# Altium footprint library ALL.PcbLib: 385 footprints (part 1 of 25)
Each footprint in its own frame and in the unit in brackets; x right, y up, seen from the top. Pads: shape width x height; smd on the part's side, far side on the other; paste and mask are expansions set on the pad; w line width, h text height; cw(c..) or ccw(c..) is an arc to the next point about the centre after c.
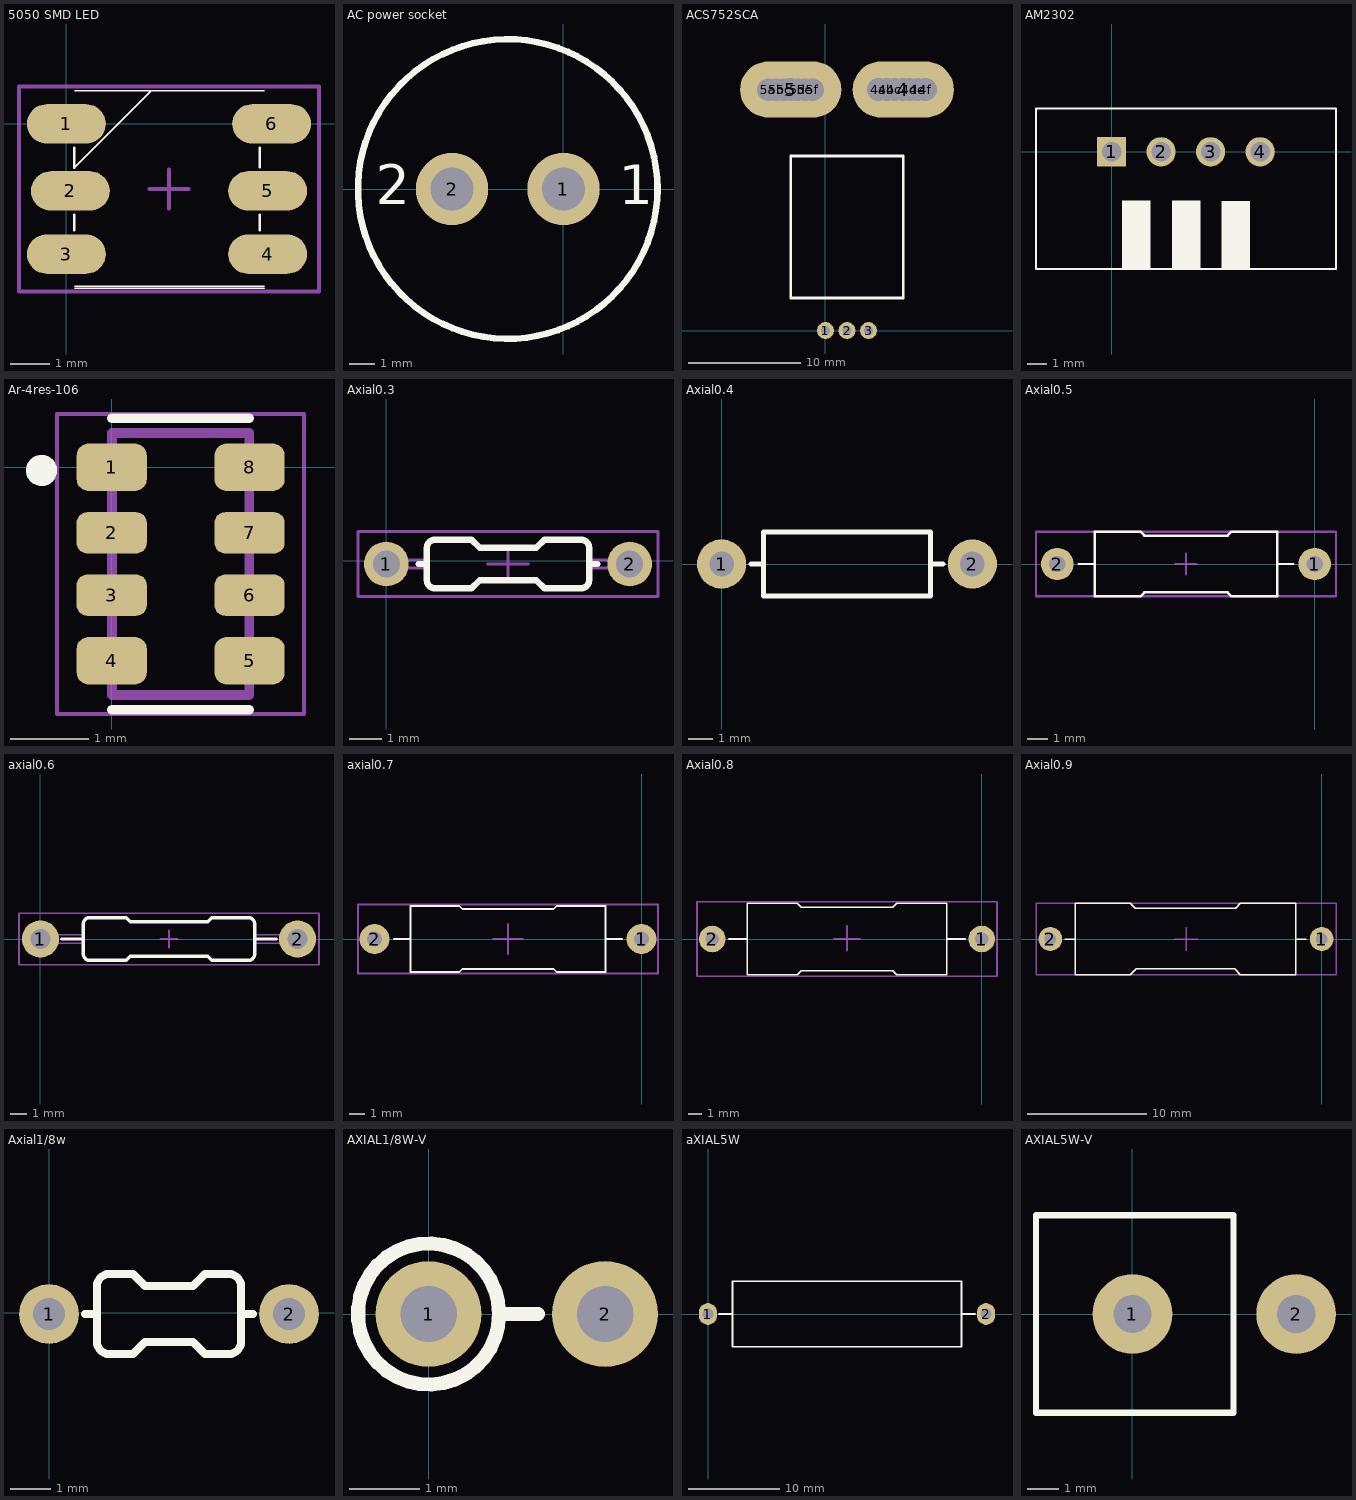
[diagram p0: the footprints below, top view; thin cyan lines are the x and y axes]

## 5050 SMD LED [mm]
pads (6):
  oval 2x1 smd: 1(0,0) 2(0.1,-1.7) 3(0,-3.3) 4(5.1,-3.3) 5(5.1,-1.7) 6(5.2,0)
Top Overlay:
  lines w0.04: 0.2,-1.114 2.125,0.811 ; 0.21,-4.164 5.01,-4.164 ; 0.21,-4.114 5.01,-4.114 ; 0.21,0.836 0.909,0.836 5.01,0.836
  lines w0.06: 0.2,-2.7 0.2,-2.3 ; 0.2,-1.114 0.2,-0.6 ; 4.9,-2.7 4.9,-2.3 ; 4.9,-1.1 4.9,-0.6
Mechanical 15:
  lines w0.1: 2.1,-1.65 3.1,-1.65 ; 2.6,-2.15 2.6,-1.15 ; -1.2,-4.25 -1.2,0.95 6.4,0.95 6.4,-4.25 -1.2,-4.25
3D body "User Library-APA102C.STEP": height 1.55, standoff 0, extent -0.15,-4.15 5.35,0.85

## AC power socket [mil]
pads (2):
  round 110 hole 65: 1(0,0) 2(-170,0)
Top Overlay:
  circle w10: c-85,0 r228.35
  text "1" at 84.11,-23.62 h60
  text "2" at -285.97,-23.62 h60
3D body "2PIN1.STEP": height 641.73, standoff -98.43, extent -382.24,-297.24 212.25,297.25

## ACS752SCA [mil]
pads (17):
  round 59.06 hole 31.5: 1(0,0) 2(75.2,0) 3(150.39,0)
  oval 353.63x196.63 hole 80: 4(272.05,842.52) 5(-121.65,842.52)
  round 70 hole 80: 4a(185.97,842.52) 4b(214.2,842.52) 4c(240.71,842.52) 4d(295.46,842.52) 4e(322.2,842.52) 4f(350.2,842.52) 5a(-199.8,842) 5b(-170.8,842) 5c(-144.8,842) 5d(-97.8,842) 5e(-70.8,842) 5f(-44.8,842)
Top Overlay:
  lines w10: -121.65,114.17 272.05,114.17 272.05,610.24 -121.65,610.24 -121.65,114.17
3D body: height 159.45, standoff -118.11, extent 65.35,-7.48 85.04,7.48
3D body: height 287.4, standoff 11.81, extent -121.65,114.17 272.05,610.24
3D body: height 177.17, standoff 118.11, extent -202.36,283.46 -40.94,874.02
3D body: height 177.17, standoff 118.11, extent 191.34,283.46 352.76,874.02
3D body: height 118.11, standoff -125.98, extent -202.36,811.02 -40.94,874.02
3D body: height 118.11, standoff -125.98, extent 191.34,811.02 352.76,874.02
3D body: height 159.45, standoff -118.11, extent -9.84,-7.48 9.84,7.48
3D body: height 159.45, standoff -118.11, extent 140.55,-7.48 160.24,7.48
3D body: height 174.41, standoff 159.45, extent 140.55,-7.48 160.24,114.17
3D body: height 174.41, standoff 159.45, extent 65.35,-7.48 85.04,114.17
3D body: height 174.41, standoff 159.45, extent -9.84,-7.48 9.84,114.17

## AM2302 [mm]
pads (4):
  rect 1.5x1.5 hole 1: 1(0,0)
  round 1.5 hole 1: 2(2.54,0) 3(5.08,0) 4(7.62,0)
Top Overlay:
  rectangle: 0.53,-6.03 1.99,-2.5
  rectangle: 3.09,-6.03 4.55,-2.5
  rectangle: 5.63,-6.05 7.09,-2.52
  lines w0.1: -3.878,2.22 11.512,2.22 11.512,-6.01 ; -3.878,2.23 -3.878,-6.02 11.502,-6.02
3D body "User Library-DHT22.step": height 29.1, standoff -4.5, extent -3.728,-5.91 11.372,2.1

## Ar-4res-106 [mm]
pads (8):
  rrect50% 0.9x0.61 smd: 1(0,0) 4(0,-2.48) 5(1.77,-2.48) 8(1.77,0)
  rrect50% 0.9x0.53 smd: 2(0,-0.84) 3(0,-1.64) 6(1.77,-1.64) 7(1.77,-0.84)
Top Overlay:
  circle w0.2: c-0.9,-0.04 r0.1
  lines w0.127: 0.005,-3.11 1.765,-3.11 ; 0.005,0.63 1.765,0.63 0.005,0.63
Mechanical 13:
  circle w0.2: c-0.9,-0.04 r0.1
  lines w0.127: 0.005,0.44 1.765,0.44 ; 0.005,0.44 0.005,-2.92 1.765,-2.92 1.765,0.44 ; 0.005,0.44 1.765,0.44
Mechanical 15:
  lines w0.05: -0.7,-3.165 2.47,-3.165 2.47,0.685 -0.7,0.685 -0.7,-3.165
3D body "YC164-FR-073R9L (1).STEP": height 0.7, standoff 0, extent 0.085,-2.84 1.685,0.36

## Axial0.3 [mm]
pads (2):
  round 1.4 hole 0.85: 1(0,-0.102) 2(7.62,-0.102)
Top Overlay:
  lines w0.2: 1.016,-0.102 1.27,-0.102 ; 6.353,-0.102 6.604,-0.102 ; 1.27,-0.61 ccw(c1.524,-0.61) 1.524,-0.864 2.667,-0.864 2.921,-0.61 4.699,-0.61 4.953,-0.864 6.096,-0.864 ccw(c6.096,-0.61) 6.35,-0.61 6.35,0.406 ccw(c6.096,0.406) 6.096,0.66 4.953,0.66 4.699,0.406 2.921,0.406 2.667,0.66 1.524,0.66 ccw(c1.524,0.406) 1.27,0.406 1.27,-0.61
Mechanical 13:
  lines w0.1: 0.127,-0.229 0.127,0.025 ; 1.27,-0.229 -0.127,-0.229 cw(c-0.127,-0.102) -0.254,-0.102 cw(c-0.127,-0.102) -0.127,0.025 1.27,0.025 ; 6.35,-0.229 7.747,-0.229 ccw(c7.747,-0.102) 7.874,-0.102 ccw(c7.747,-0.102) 7.747,0.025 6.35,0.025 ; 7.493,-0.229 7.493,0.025 ; 1.27,-0.61 ccw(c1.524,-0.61) 1.524,-0.864 2.667,-0.864 2.921,-0.61 4.699,-0.61 4.953,-0.864 6.096,-0.864 ccw(c6.096,-0.61) 6.35,-0.61 6.35,0.406 ccw(c6.096,0.406) 6.096,0.66 4.953,0.66 4.699,0.406 2.921,0.406 2.667,0.66 1.524,0.66 ccw(c1.524,0.406) 1.27,0.406 1.27,-0.61
Mechanical 15:
  lines w0.1: 3.175,-0.102 3.81,-0.102 ; 3.81,-0.61 3.81,-0.102 ; 3.81,0.406 3.81,-0.102 ; 4.445,-0.102 3.81,-0.102 ; -0.889,-1.118 8.509,-1.118 8.509,0.914 -0.889,0.914 -0.889,-1.118
3D body: height 1.52, standoff 0, extent 1.269,-0.864 6.351,0.661
3D body: height 0.9, standoff 0.7, extent 0.127,-0.229 1.27,0.025
3D body: height 0.9, standoff 0, extent -0.254,-0.229 0.127,0.025
3D body: height 0.9, standoff 0, extent 7.493,-0.229 7.874,0.025
3D body: height 0.9, standoff 0.7, extent 6.35,-0.229 7.493,0.025

## Axial0.4 [mm]
pads (2):
  round 2 hole 1: 1(0,0) 2(10.2,0)
Top Overlay:
  lines w0.2: 1.2,0 1.7,0 ; 8.475,-1.3 1.7,-1.3 1.7,1.3 8.475,1.3 ; 8.5,-1.3 8.5,1.3 ; 8.5,0 9,0
3D body "RESTH_Axial-0.4.STEP": height 2.6, standoff -2.54, extent -0.28,-1.277 10.48,1.277

## Axial0.5 [mm]
pads (2):
  round 1.6 hole 0.8: 1(0,0) 2(-12.7,0)
Top Overlay:
  lines w0.12: -11.65,0 -10.85,0 ; -1.85,0 -1.05,0 ; -10.85,-1.6 -8.6,-1.6 -8.4,-1.4 -4.3,-1.4 -4.1,-1.6 -1.85,-1.6 -1.85,1.6 -4.1,1.6 -4.3,1.4 -8.4,1.4 -8.6,1.6 -10.85,1.6 -10.85,-1.6
Mechanical 15:
  lines w0.12: -6.85,0 -5.85,0 ; -6.35,-0.5 -6.35,0.5 ; -13.75,-1.6 1.05,-1.6 1.05,1.6 -13.75,1.6 -13.75,-1.6
3D body "User Library-RES-1_5W.STEP": height 3.5, standoff -3, extent -12.919,-1.697 0.321,1.803

## axial0.6 [mm]
pads (2):
  round 2.2 hole 1.2: 1(0,0) 2(15.24,0)
Top Overlay:
  lines w0.2: 1.27,0 2.54,0 ; 12.192,-1.27 12.319,-1.27 ; 12.7,0 13.97,0 ; 12.319,-1.27 ccw(c12.319,-0.889) 12.7,-0.889 12.7,0.889 ccw(c12.319,0.889) 12.319,1.27 10.16,1.27 9.906,1.016 5.334,1.016 5.08,1.27 2.921,1.27 ccw(c2.921,0.889) 2.54,0.889 2.54,-0.889 ccw(c2.921,-0.889) 2.921,-1.27 5.08,-1.27 5.334,-1.016 9.906,-1.016 10.16,-1.27 12.319,-1.27
Mechanical 13:
  lines w0.1: 0.254,-0.254 0.254,0.254 ; 2.54,-0.254 0,-0.254 cw(c0,-0.127) -0.127,-0.127 -0.127,0.127 cw(c0,0.127) 0,0.254 2.54,0.254 ; 12.192,-1.27 12.319,-1.27 ; 12.7,-0.254 15.24,-0.254 ccw(c15.24,-0.127) 15.367,-0.127 15.367,0.127 ccw(c15.24,0.127) 15.24,0.254 12.7,0.254 ; 14.986,-0.254 14.986,0.254 ; 12.319,-1.27 ccw(c12.319,-0.889) 12.7,-0.889 12.7,0.889 ccw(c12.319,0.889) 12.319,1.27 10.16,1.27 9.906,1.016 5.334,1.016 5.08,1.27 2.921,1.27 ccw(c2.921,0.889) 2.54,0.889 2.54,-0.889 ccw(c2.921,-0.889) 2.921,-1.27 5.08,-1.27 5.334,-1.016 9.906,-1.016 10.16,-1.27 12.319,-1.27
Mechanical 15:
  lines w0.1: 7.112,0 7.62,0 ; 7.62,-0.508 7.62,0 ; 7.62,0.508 7.62,0 ; 8.128,0 7.62,0 ; -1.27,-1.524 -1.27,1.524 16.51,1.524 16.51,-1.524 -1.27,-1.524
3D body "SW3dPS-5083NW20K00J12AFX-2.STEP": height 3.66, standoff -2.53, extent -0.483,-1.753 15.557,1.747

## axial0.7 [mm]
pads (2):
  round 2 hole 1: 1(0,0) 2(-17.8,0)
Top Overlay:
  lines w0.12: -16.5,0 -15.4,0 ; -2.4,0 -1.3,0 ; -15.4,-2.2 -15.4,2.2 -12.15,2.2 -11.95,2 -5.85,2 -5.65,2.2 -2.4,2.2 -2.4,-2.2 -5.65,-2.2 -5.85,-2 -11.95,-2 -12.15,-2.2 -15.4,-2.2
Mechanical 15:
  lines w0.12: -9.9,0 -7.9,0 ; -8.9,-1 -8.9,1 ; -18.9,-2.3 -18.9,2.3 1.1,2.3 1.1,-2.3 -18.9,-2.3
3D body "User Library-Res70 1W SilCoat.STEP": height 4.62, standoff -1.9, extent -18.165,-2.25 0.365,2.25

## Axial0.8 [mm]
pads (2):
  round 2 hole 1: 1(0,0) 2(-20.3,0)
Top Overlay:
  lines w0.12: -19.05,0 -17.65,0 ; -2.65,0 -1.25,0 ; -17.65,-2.7 -17.65,2.7 -13.9,2.7 -13.6,2.4 -6.7,2.4 -6.4,2.7 -2.65,2.7 -2.65,-2.7 -6.4,-2.7 -6.7,-2.4 -13.6,-2.4 -13.9,-2.7 -17.65,-2.7
Mechanical 15:
  lines w0.12: -11.15,0 -9.15,0 ; -10.15,-0.9 -10.15,1 ; -21.45,-2.8 -21.45,2.8 1.15,2.8 1.15,-2.8 -21.45,-2.8
3D body "User Library-Res80 2W SilCoat.STEP": height 5.67, standoff -1.6, extent -20.715,-2.75 0.415,2.75

## Axial0.9 [mm]
pads (2):
  round 2 hole 1: 1(0,0) 2(-22.8,0)
Top Overlay:
  lines w0.12: -21.6,0 -20.7,0 ; -2.2,0 -1.3,0 ; -20.7,-3 -16.075,-3 -15.575,-2.5 -7.325,-2.5 -6.825,-3 -2.2,-3 -2.2,3 -6.825,3 -7.225,2.6 -15.675,2.6 -16.075,3 -20.7,3 -20.7,-3
Mechanical 15:
  lines w0.12: -12.4,0 -10.4,0 ; -11.4,-1 -11.4,1 ; -24,-3 -24,3 1.2,3 1.2,-3 -24,-3
3D body "User Library-Res90 3W SilCoat.STEP": height 6.23, standoff -1.8, extent -23.235,-3.01 0.435,3.01

## Axial1/8w [mm]
pads (2):
  round 1.5 hole 0.8: 1(0,-0.025) 2(6,-0.025)
Top Overlay:
  lines w0.2: 0.9,-0.025 1.2,-0.025 ; 4.8,-0.025 5.1,-0.025 ; 1.2,-0.725 ccw(c1.5,-0.725) 1.5,-1.025 2.1,-1.025 2.4,-0.725 3.6,-0.725 3.9,-1.025 4.5,-1.025 ccw(c4.5,-0.725) 4.8,-0.725 4.8,0.675 ccw(c4.5,0.675) 4.5,0.975 3.9,0.975 3.6,0.675 2.4,0.675 2.1,0.975 1.5,0.975 ccw(c1.5,0.675) 1.2,0.675 1.2,-0.725
3D body "User Library-Res_1-8w_1_0.step": height 1.9, standoff -2, extent -0.2,-0.925 6.2,0.875

## AXIAL1/8W-V [mm]
pads (2):
  round 1.5 hole 0.8: 1(0,0) 2(2.5,0)
Top Overlay:
  circle w0.2: c0,0 r1
  lines w0.2: 1,0 1.55,0
3D body "User Library-RESAD250W50L320D180_0_125W.STEP": height 6.65, standoff -2.6, extent -0.9,-0.9 2.75,0.9

## aXIAL5W [mm]
pads (2):
  oval 2x2.4 hole 1.2: 1(-0.025,0) 2(30.575,0)
Top Overlay:
  lines w0.2: 1.175,0 2.675,0 ; 27.875,0 29.375,0 ; 2.675,-3.6 2.675,3.6 27.875,3.6 27.875,-3.6 2.675,-3.6
3D body "RES 5W.STEP": height 8.35, standoff -2.85, extent -0.37,-3.5 30.91,3.5

## AXIAL5W-V [mm]
pads (2):
  round 2.5 hole 1.2: 1(0,0) 2(5.14,0)
Top Overlay:
  lines w0.2: -3.03,-3.1 3.17,-3.1 3.17,3.1 -3.03,3.1 -3.03,-3.1
3D body "User Library-RES-5W-Vert.STEP": height 26.6, standoff -3, extent -2.97,-3.005 5.51,3.009